# Altium schematic symbol library IC.SchLib: 555 symbols (part 6 of 15)
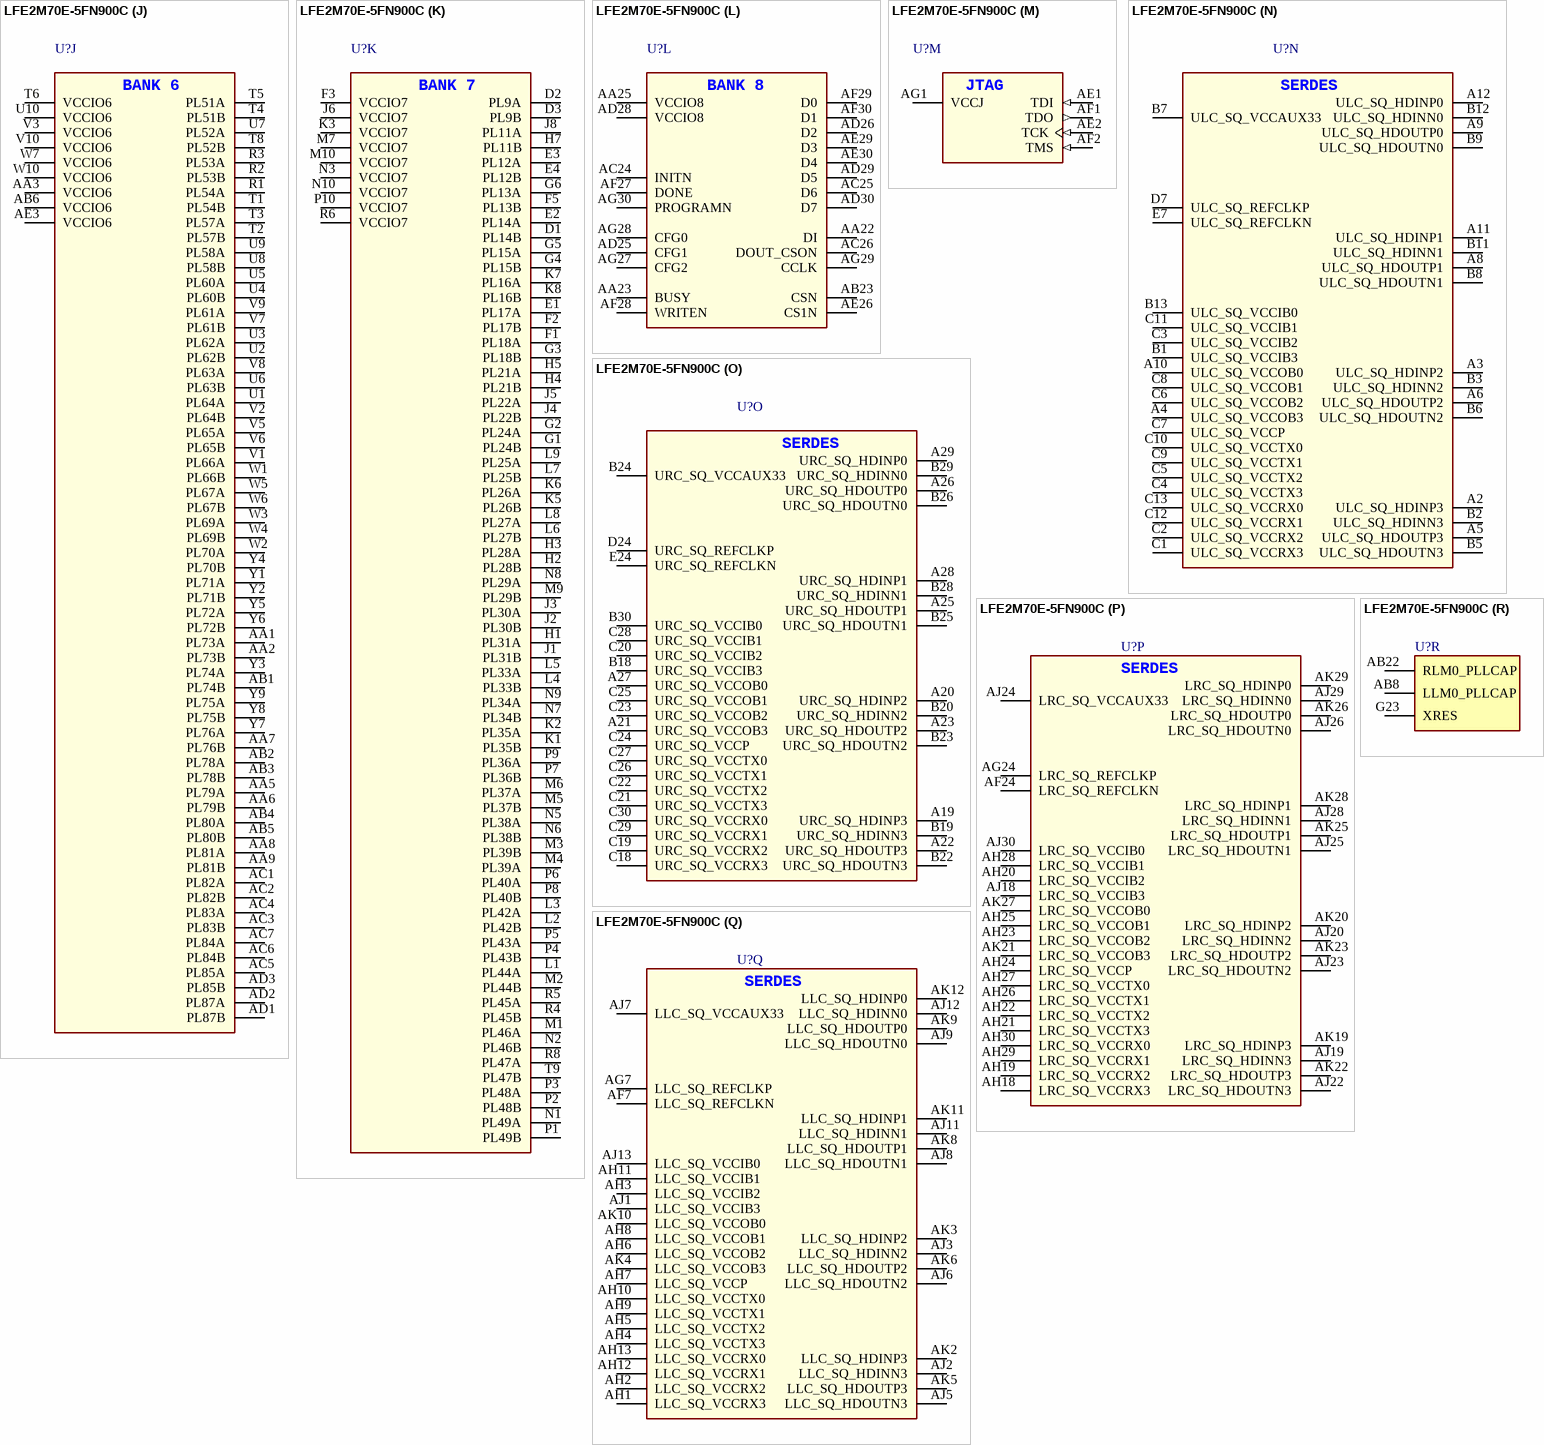
[diagram p75: symbol LFE2M70E-5FN900C]

## LFE2M70E-5FN900C
designator U?, comment LFE2M70-5FN900C  (value not drawn)
ECP2M 1.2V  FPGA, 416 I/Os, 95K LUTs, 900-Ball fpBGA, Speed Grade 5, Commercial Grade, Pb-Free; Manufacturer: Lattice; Sort: 510; Tech: SMDR; Manufacturer No: LFE2M70-5FN900C; Package: FPBGA900; Price: 0
footprint FPBGA900 (BGA, 900-Leads, Body 31,0x31,0mm,  Pitch 1,00mm)
part A pins: AA10 VCCAUX (power), AA11 VCCAUX (power), AA20 VCCAUX (power), AA21 VCCAUX (power), K10 VCCAUX (power), K11 VCCAUX (power), K20 VCCAUX (power), K21 VCCAUX (power), L10 VCCAUX (power), L11 VCCAUX (power), L12 VCC (power), L13 VCC (power), L18 VCC (power), L19 VCC (power), L20 VCCAUX (power), L21 VCCAUX (power), M11 VCC (power), M12 VCC (power), M13 VCC (power), M14 VCC (power), M15 VCC (power), M16 VCC (power), M17 VCC (power), M18 VCC (power), M19 VCC (power), M20 VCC (power), N11 VCC (power), N12 VCC (power), N13 VCCPLL (power), N18 VCCPLL (power), N19 VCC (power), N20 VCC (power), P12 VCC (power), P19 VCC (power), R12 VCC (power), R19 VCC (power), T12 VCC (power), T19 VCC (power), U12 VCC (power), U19 VCC (power), V11 VCC (power), V12 VCC (power), V13 VCCPLL (power), V18 VCCPLL (power), V19 VCC (power), V20 VCC (power), W11 VCC (power), W12 VCC (power), W13 VCC (power), W14 VCC (power), W15 VCC (power), W16 VCC (power), W17 VCC (power), W18 VCC (power), W19 VCC (power), W20 VCC (power), Y10 VCCAUX (power), Y11 VCCAUX (power), Y12 VCC (power), Y13 VCC (power), Y18 VCC (power), Y19 VCC (power), Y20 VCCAUX (power), Y21 VCCAUX (power)
part B pins: A1 GND (power), A7 GND (power), A13 GND (power), A18 GND (power), A24 GND (power), A30 GND (power), AA4 GND (power), AA14 GND (power), AA15 GND (power), AA16 GND (power), AA17 GND (power), AA24 GND (power), AA27 GND (power), AB7 GND (power), AB24 GND (power), AD12 GND (power), AD19 GND (power), AD27 GND (power), AE4 GND (power), AE9 GND (power), AE22 GND (power), AE27 GND (power), AF6 GND (power), AF14 GND (power), AF17 GND (power), AF25 GND (power), AJ4 GND (power), AJ10 GND (power), AJ21 GND (power), AJ27 GND (power), AK1 GND (power), AK7 GND (power), AK13 GND (power), AK18 GND (power), AK24 GND (power), AK30 GND (power), B4 GND (power), B10 GND (power), B21 GND (power), B27 GND (power), D6 GND (power), D25 GND (power), E14 GND (power), E17 GND (power), F4 GND (power), F9 GND (power), F22 GND (power), F27 GND (power), G12 GND (power), G19 GND (power), J7 GND (power), J24 GND (power), K4 GND (power), K14 GND (power), K15 GND (power), K16 GND (power), K17 GND (power), K27 GND (power), L14 GND (power), L15 GND (power), L16 GND (power), L17 GND (power), M8 GND (power), M23 GND (power), N4 GND (power), N14 GND (power), N15 GND (power), N16 GND (power), N17 GND (power), N27 GND (power), P11 GND (power), P13 GND (power), P14 GND (power), P15 GND (power), P16 GND (power), P17 GND (power), P18 GND (power), P20 GND (power), R7 GND (power), R10 GND (power), R11 GND (power), R13 GND (power), R14 GND (power), R15 GND (power), R16 GND (power), R17 GND (power), R18 GND (power), R20 GND (power), R21 GND (power), R24 GND (power), T7 GND (power), T10 GND (power), T11 GND (power), T13 GND (power), T14 GND (power), T15 GND (power), T16 GND (power), T17 GND (power), T18 GND (power), T20 GND (power), T21 GND (power), T24 GND (power), U11 GND (power), U13 GND (power), U14 GND (power), U15 GND (power), U16 GND (power), U17 GND (power), U18 GND (power), U20 GND (power), V4 GND (power), V14 GND (power), V15 GND (power), V16 GND (power), V17 GND (power), V27 GND (power), W8 GND (power), W23 GND (power), Y14 GND (power), Y15 GND (power), Y16 GND (power), Y17 GND (power)
part C pins: AA26 NC, AB9 NC, AB10 NC, AB11 NC, AB12 NC, AB13 NC, AB14 NC, AB15 NC, AB16 NC, AB17 NC, AB19 NC, AB20 NC, AB21 NC, AC8 NC, AC9 NC, AC10 NC, AC11 NC, AC21 NC, AC22 NC, AD4 NC, AD5 NC, AD6 NC, AD7 NC, AD8 NC, AD21 NC, AD22 NC, AE5 NC, AE6 NC, AE7 NC, AE23 NC, AF5 NC, AF20 NC, AF23 NC, AG23 NC, AG26 NC, D10 NC, E10 NC, E11 NC, F8 NC, F10 NC, F20 NC, F23 NC, G7 NC, G8 NC, G9 NC, G10 NC, G20 NC, G21 NC, H6 NC, H8 NC, H9 NC, H19 NC, H20 NC, H21 NC, H22 NC, J9 NC, J10 NC, J20 NC, J21 NC, K9 NC, R9 NC, U22 NC, W9 NC
part D pins: A14 PT51B, B14 PT51A, C14 PT54B, C15 PT55B, D4 PT47B, D5 PT47A, D8 PT43A, D9 PT39A, D11 PT30A, D12 PT37B, D13 PT50B, D14 VCCIO0 (power), D15 PT55A, E5 PT46B, E6 VCCIO0 (power), E8 PT39B, E9 VCCIO0 (power), E12 PT30B, E13 PT37A, E15 PT54A, F6 PT46A, F7 PT43B, F11 PT29A, F12 VCCIO0 (power), F13 PT50A, F14 PT52B, G11 PT41A, G13 PT49B, G14 PT53B, H10 PT31A, H11 PT29B, H12 PT40A, H13 PT40B, H14 PT52A, J11 PT49A, J12 PT31B, J13 PT41B, J14 PT53A, K12 VCCIO0 (power), K13 VCCIO0 (power)
part E pins: A15 PT57B, A16 PT63B, A17 PT73B, B15 PT57A, B16 PT63A, B17 PT73A, C16 PT59B, C17 PT74A, D16 PT59A, D17 VCCIO1 (power), D18 PT74B, D19 PT75B, D20 PT77B, D21 PT77A, D22 PT79B, D23 PT82B, D26 PT81B, E16 PT56A, E18 PT75A, E19 PT76A, E20 PT76B, E21 PT82A, E22 VCCIO1 (power), E23 PT80B, E25 VCCIO1 (power), E26 PT81A, F15 PT56B, F16 PT61A, F17 PT64A, F18 PT64B, F19 VCCIO1 (power), F21 PT79A, G15 PT60A, G16 PT62A, G17 PT62B, G18 PT78B, G22 PT80A, H15 PT58A, H16 PT61B, H17 PT65B, H18 PT78A, J15 PT58B, J16 PT60B, J17 PT65A, J18 PT66B, J19 PT66A, K18 VCCIO1 (power), K19 VCCIO1 (power)
part F pins: D27 PR12B, D28 PR14B, D29 PR25A, D30 PR25B, E27 PR12A, E28 PR14A, E29 PR30A, E30 PR30B, F24 PR9B, F25 PR9A, F26 PR11B, F28 VCCIO2 (power), F29 PR31A, F30 PR31B, G24 PR13B, G25 PR11A, G26 PR16A, G27 PR27A, G28 PR27B, G29 PR34A, G30 PR38A, H23 PR15B, H24 PR15A, H25 PR13A, H26 PR17A, H27 PR16B, H28 PR28B, H29 PR34B, H30 PR38B, J22 PR20B, J23 PR20A, J25 VCCIO2 (power), J26 PR17B, J27 PR22B, J28 PR28A, J29 PR43A, J30 PR43B, K22 PR21A, K23 PR21B, K24 PR24B, K25 PR24A, K26 PR22A, K28 VCCIO2 (power), K29 PR45A, K30 PR45B, L22 PR33B, L23 PR26A, L24 PR26B, L25 PR29B, L26 PR29A, L27 PR35A, L28 PR35B, L29 PR36A, L30 PR36B, M21 VCCIO2 (power), M22 PR33A, M24 VCCIO2 (power), M25 PR37B, M26 PR37A, M27 PR39B, M28 PR39A, M29 PR49A, M30 PR49B, N21 VCCIO2 (power), N22 PR44B, N23 PR42A, N24 PR42B, N25 PR40B, N26 PR40A, N28 VCCIO2 (power), P21 VCCIO2 (power), P22 PR44A, P23 PR48B, P24 PR48A, P25 PR46B, P26 PR46A, P27 PR47A, R25 VCCIO2 (power), R26 PR47B
part G pins: AA28 VCCIO3 (power), AA29 PR78B, AA30 PR83A, AB25 VCCIO3 (power), AB26 PR80B, AB27 PR80A, AB28 PR82A, AB29 PR82B, AB30 PR83B, AC27 PR85B, AC28 PR85A, AC29 PR84B, AC30 PR84A, AE28 VCCIO3 (power), N29 PR53A, N30 PR53B, P28 PR51A, P29 PR51B, P30 PR57B, R22 PR58A, R23 PR58B, R27 PR52B, R28 PR52A, R29 PR57A, R30 PR62A, T22 PR61A, T23 PR61B, T25 VCCIO3 (power), T26 PR56A, T27 PR56B, T28 PR60A, T29 PR60B, T30 PR62B, U21 VCCIO3 (power), U23 PR65B, U24 PR63A, U25 PR63B, U26 PR64A, U27 PR66A, U28 PR66B, U29 PR71B, U30 PR70A, V21 VCCIO3 (power), V22 PR75A, V23 PR65A, V24 PR67B, V25 PR67A, V26 PR64B, V28 VCCIO3 (power), V29 PR71A, V30 PR70B, W21 VCCIO3 (power), W22 PR75B, W24 VCCIO3 (power), W25 PR72B, W26 PR72A, W27 PR69B, W28 PR69A, W29 PR73A, W30 PR73B, Y22 PR81B, Y23 PR81A, Y24 PR79B, Y25 PR79A, Y26 PR74A, Y27 PR74B, Y28 PR78A, Y29 PR76A, Y30 PR76B
part H pins: AA18 VCCIO4 (power), AA19 VCCIO4 (power), AB18 PB79A, AC17 PB62B, AC18 PB75B, AC19 PB78A, AC20 PB79B, AC23 PB81A, AD16 PB60B, AD17 PB67A, AD18 PB75A, AD20 PB78B, AD23 PB81B, AD24 PB74A, AE17 PB62A, AE18 PB76A, AE19 VCCIO4 (power), AE20 PB80A, AE21 PB80B, AE24 PB74B, AE25 PB73B, AF18 PB60A, AF19 PB67B, AF21 PB66A, AF22 VCCIO4 (power), AF26 PB73A, AG16 PB61B, AG17 VCCIO4 (power), AG18 PB65A, AG19 PB76B, AG20 PB64A, AG21 PB64B, AG22 PB66B, AG25 VCCIO4 (power), AH16 PB63A, AH17 PB71A, AJ14 PB58A, AJ15 PB61A, AJ16 PB65B, AJ17 PB71B, AK14 PB58B, AK15 PB59A, AK16 PB59B, AK17 PB63B
part I pins: AA12 VCCIO5 (power), AA13 VCCIO5 (power), AC12 PB33B, AC13 PB35B, AC14 PB36B, AC15 PB42B, AC16 PB52A, AD9 PB31B, AD10 PB32B, AD11 PB39A, AD13 PB35A, AD14 PB40B, AD15 PB47A, AE8 PB30B, AE10 PB32A, AE11 PB31A, AE12 VCCIO5 (power), AE13 PB33A, AE14 PB36A, AE15 PB42A, AE16 PB52B, AF3 PB37A, AF4 PB37B, AF8 PB41B, AF9 VCCIO5 (power), AF10 PB30A, AF11 PB53B, AF12 PB40A, AF13 PB39B, AF15 PB47B, AF16 PB51A, AG2 PB34A, AG3 PB34B, AG4 PB38A, AG5 PB38B, AG6 VCCIO5 (power), AG8 PB41A, AG9 PB48B, AG10 PB48A, AG11 PB53A, AG12 PB49B, AG13 PB50B, AG14 VCCIO5 (power), AG15 PB50A, AH14 PB49A, AH15 PB51B
part J pins: AA1 PL73A, AA2 PL73B, AA3 VCCIO6 (power), AA5 PL79A, AA6 PL79B, AA7 PL76B, AA8 PL81A, AA9 PL81B, AB1 PL74B, AB2 PL78A, AB3 PL78B, AB4 PL80A, AB5 PL80B, AB6 VCCIO6 (power), AC1 PL82A, AC2 PL82B, AC3 PL83B, AC4 PL83A, AC5 PL85A, AC6 PL84B, AC7 PL84A, AD1 PL87B, AD2 PL87A, AD3 PL85B, AE3 VCCIO6 (power), R1 PL54A, R2 PL53B, R3 PL53A, T1 PL54B, T2 PL57B, T3 PL57A, T4 PL51B, T5 PL51A, T6 VCCIO6 (power), T8 PL52B, U1 PL64A, U2 PL62B, U3 PL62A, U4 PL60B, U5 PL60A, U6 PL63B, U7 PL52A, U8 PL58B, U9 PL58A, U10 VCCIO6 (power), V1 PL66A, V2 PL64B, V3 VCCIO6 (power), V5 PL65A, V6 PL65B, V7 PL61B, V8 PL63A, V9 PL61A, V10 VCCIO6 (power), W1 PL66B, W2 PL70A, W3 PL69A, W4 PL69B, W5 PL67A, W6 PL67B, W7 VCCIO6 (power), W10 VCCIO6 (power), Y1 PL71A, Y2 PL71B, Y3 PL74A, Y4 PL70B, Y5 PL72A, Y6 PL72B, Y7 PL76A, Y8 PL75B, Y9 PL75A
part K pins: D1 PL14B, D2 PL9A, D3 PL9B, E1 PL17A, E2 PL14A, E3 PL12A, E4 PL12B, F1 PL18A, F2 PL17B, F3 VCCIO7 (power), F5 PL13B, G1 PL24B, G2 PL24A, G3 PL18B, G4 PL15B, G5 PL15A, G6 PL13A, H1 PL31A, H2 PL28B, H3 PL28A, H4 PL21B, H5 PL21A, H7 PL11B, J1 PL31B, J2 PL30B, J3 PL30A, J4 PL22B, J5 PL22A, J6 VCCIO7 (power), J8 PL11A, K1 PL35B, K2 PL35A, K3 VCCIO7 (power), K5 PL26B, K6 PL26A, K7 PL16A, K8 PL16B, L1 PL44A, L2 PL42B, L3 PL42A, L4 PL33B, L5 PL33A, L6 PL27B, L7 PL25B, L8 PL27A, L9 PL25A, M1 PL46A, M2 PL44B, M3 PL39B, M4 PL39A, M5 PL37B, M6 PL37A, M7 VCCIO7 (power), M9 PL29B, M10 VCCIO7 (power), N1 PL49A, N2 PL46B, N3 VCCIO7 (power), N5 PL38A, N6 PL38B, N7 PL34B, N8 PL29A, N9 PL34A, N10 VCCIO7 (power), P1 PL49B, P2 PL48B, P3 PL48A, P4 PL43B, P5 PL43A, P6 PL40A, P7 PL36B, P8 PL40B, P9 PL36A, P10 VCCIO7 (power), R4 PL45B, R5 PL45A, R6 VCCIO7 (power), R8 PL47A, T9 PL47B
part L pins: AA22 DI, AA23 BUSY, AA25 VCCIO8 (power), AB23 CSN, AC24 INITN, AC25 D6, AC26 DOUT_CSON, AD25 CFG1, AD26 D2, AD28 VCCIO8 (power), AD29 D5, AD30 D7, AE26 CS1N, AE29 D3, AE30 D4, AF27 DONE, AF28 WRITEN, AF29 D0, AF30 D1, AG27 CFG2, AG28 CFG0, AG29 CCLK, AG30 PROGRAMN
part M pins: AE1 TDI (in), AE2 TCK (in), AF1 TDO (out), AF2 TMS (in), AG1 VCCJ (power)
part N pins: A2 ULC_SQ_HDINP3, A3 ULC_SQ_HDINP2, A4 ULC_SQ_VCCOB3, A5 ULC_SQ_HDOUTP3, A6 ULC_SQ_HDOUTP2, A8 ULC_SQ_HDOUTP1, A9 ULC_SQ_HDOUTP0, A10 ULC_SQ_VCCOB0, A11 ULC_SQ_HDINP1, A12 ULC_SQ_HDINP0, B1 ULC_SQ_VCCIB3, B2 ULC_SQ_HDINN3, B3 ULC_SQ_HDINN2, B5 ULC_SQ_HDOUTN3, B6 ULC_SQ_HDOUTN2, B7 ULC_SQ_VCCAUX33, B8 ULC_SQ_HDOUTN1, B9 ULC_SQ_HDOUTN0, B11 ULC_SQ_HDINN1, B12 ULC_SQ_HDINN0, B13 ULC_SQ_VCCIB0, C1 ULC_SQ_VCCRX3, C2 ULC_SQ_VCCRX2, C3 ULC_SQ_VCCIB2, C4 ULC_SQ_VCCTX3, C5 ULC_SQ_VCCTX2, C6 ULC_SQ_VCCOB2, C7 ULC_SQ_VCCP, C8 ULC_SQ_VCCOB1, C9 ULC_SQ_VCCTX1, C10 ULC_SQ_VCCTX0, C11 ULC_SQ_VCCIB1, C12 ULC_SQ_VCCRX1, C13 ULC_SQ_VCCRX0, D7 ULC_SQ_REFCLKP, E7 ULC_SQ_REFCLKN
part O pins: A19 URC_SQ_HDINP3, A20 URC_SQ_HDINP2, A21 URC_SQ_VCCOB3, A22 URC_SQ_HDOUTP3, A23 URC_SQ_HDOUTP2, A25 URC_SQ_HDOUTP1, A26 URC_SQ_HDOUTP0, A27 URC_SQ_VCCOB0, A28 URC_SQ_HDINP1, A29 URC_SQ_HDINP0, B18 URC_SQ_VCCIB3, B19 URC_SQ_HDINN3, B20 URC_SQ_HDINN2, B22 URC_SQ_HDOUTN3, B23 URC_SQ_HDOUTN2, B24 URC_SQ_VCCAUX33, B25 URC_SQ_HDOUTN1, B26 URC_SQ_HDOUTN0, B28 URC_SQ_HDINN1, B29 URC_SQ_HDINN0, B30 URC_SQ_VCCIB0, C18 URC_SQ_VCCRX3, C19 URC_SQ_VCCRX2, C20 URC_SQ_VCCIB2, C21 URC_SQ_VCCTX3, C22 URC_SQ_VCCTX2, C23 URC_SQ_VCCOB2, C24 URC_SQ_VCCP, C25 URC_SQ_VCCOB1, C26 URC_SQ_VCCTX1, C27 URC_SQ_VCCTX0, C28 URC_SQ_VCCIB1, C29 URC_SQ_VCCRX1, C30 URC_SQ_VCCRX0, D24 URC_SQ_REFCLKP, E24 URC_SQ_REFCLKN
part P pins: AF24 LRC_SQ_REFCLKN, AG24 LRC_SQ_REFCLKP, AH18 LRC_SQ_VCCRX3, AH19 LRC_SQ_VCCRX2, AH20 LRC_SQ_VCCIB2, AH21 LRC_SQ_VCCTX3, AH22 LRC_SQ_VCCTX2, AH23 LRC_SQ_VCCOB2, AH24 LRC_SQ_VCCP, AH25 LRC_SQ_VCCOB1, AH26 LRC_SQ_VCCTX1, AH27 LRC_SQ_VCCTX0, AH28 LRC_SQ_VCCIB1, AH29 LRC_SQ_VCCRX1, AH30 LRC_SQ_VCCRX0, AJ18 LRC_SQ_VCCIB3, AJ19 LRC_SQ_HDINN3, AJ20 LRC_SQ_HDINN2, AJ22 LRC_SQ_HDOUTN3, AJ23 LRC_SQ_HDOUTN2, AJ24 LRC_SQ_VCCAUX33, AJ25 LRC_SQ_HDOUTN1, AJ26 LRC_SQ_HDOUTN0, AJ28 LRC_SQ_HDINN1, AJ29 LRC_SQ_HDINN0, AJ30 LRC_SQ_VCCIB0, AK19 LRC_SQ_HDINP3, AK20 LRC_SQ_HDINP2, AK21 LRC_SQ_VCCOB3, AK22 LRC_SQ_HDOUTP3, AK23 LRC_SQ_HDOUTP2, AK25 LRC_SQ_HDOUTP1, AK26 LRC_SQ_HDOUTP0, AK27 LRC_SQ_VCCOB0, AK28 LRC_SQ_HDINP1, AK29 LRC_SQ_HDINP0
part Q pins: AF7 LLC_SQ_REFCLKN, AG7 LLC_SQ_REFCLKP, AH1 LLC_SQ_VCCRX3, AH2 LLC_SQ_VCCRX2, AH3 LLC_SQ_VCCIB2, AH4 LLC_SQ_VCCTX3, AH5 LLC_SQ_VCCTX2, AH6 LLC_SQ_VCCOB2, AH7 LLC_SQ_VCCP, AH8 LLC_SQ_VCCOB1, AH9 LLC_SQ_VCCTX1, AH10 LLC_SQ_VCCTX0, AH11 LLC_SQ_VCCIB1, AH12 LLC_SQ_VCCRX1, AH13 LLC_SQ_VCCRX0, AJ1 LLC_SQ_VCCIB3, AJ2 LLC_SQ_HDINN3, AJ3 LLC_SQ_HDINN2, AJ5 LLC_SQ_HDOUTN3, AJ6 LLC_SQ_HDOUTN2, AJ7 LLC_SQ_VCCAUX33, AJ8 LLC_SQ_HDOUTN1, AJ9 LLC_SQ_HDOUTN0, AJ11 LLC_SQ_HDINN1, AJ12 LLC_SQ_HDINN0, AJ13 LLC_SQ_VCCIB0, AK2 LLC_SQ_HDINP3, AK3 LLC_SQ_HDINP2, AK4 LLC_SQ_VCCOB3, AK5 LLC_SQ_HDOUTP3, AK6 LLC_SQ_HDOUTP2, AK8 LLC_SQ_HDOUTP1, AK9 LLC_SQ_HDOUTP0, AK10 LLC_SQ_VCCOB0, AK11 LLC_SQ_HDINP1, AK12 LLC_SQ_HDINP0
part R pins: AB8 LLM0_PLLCAP, AB22 RLM0_PLLCAP, G23 XRES
part A text: SUPPLIES
part B text: SUPPLIES
part D text: BANK 0
part E text: BANK 1
part F text: BANK 2
part G text: BANK 3
part H text: BANK 4
part I text: BANK 5
part J text: BANK 6
part K text: BANK 7
part L text: BANK 8
part M text: JTAG
part N text: SERDES
part O text: SERDES
part P text: SERDES
part Q text: SERDES

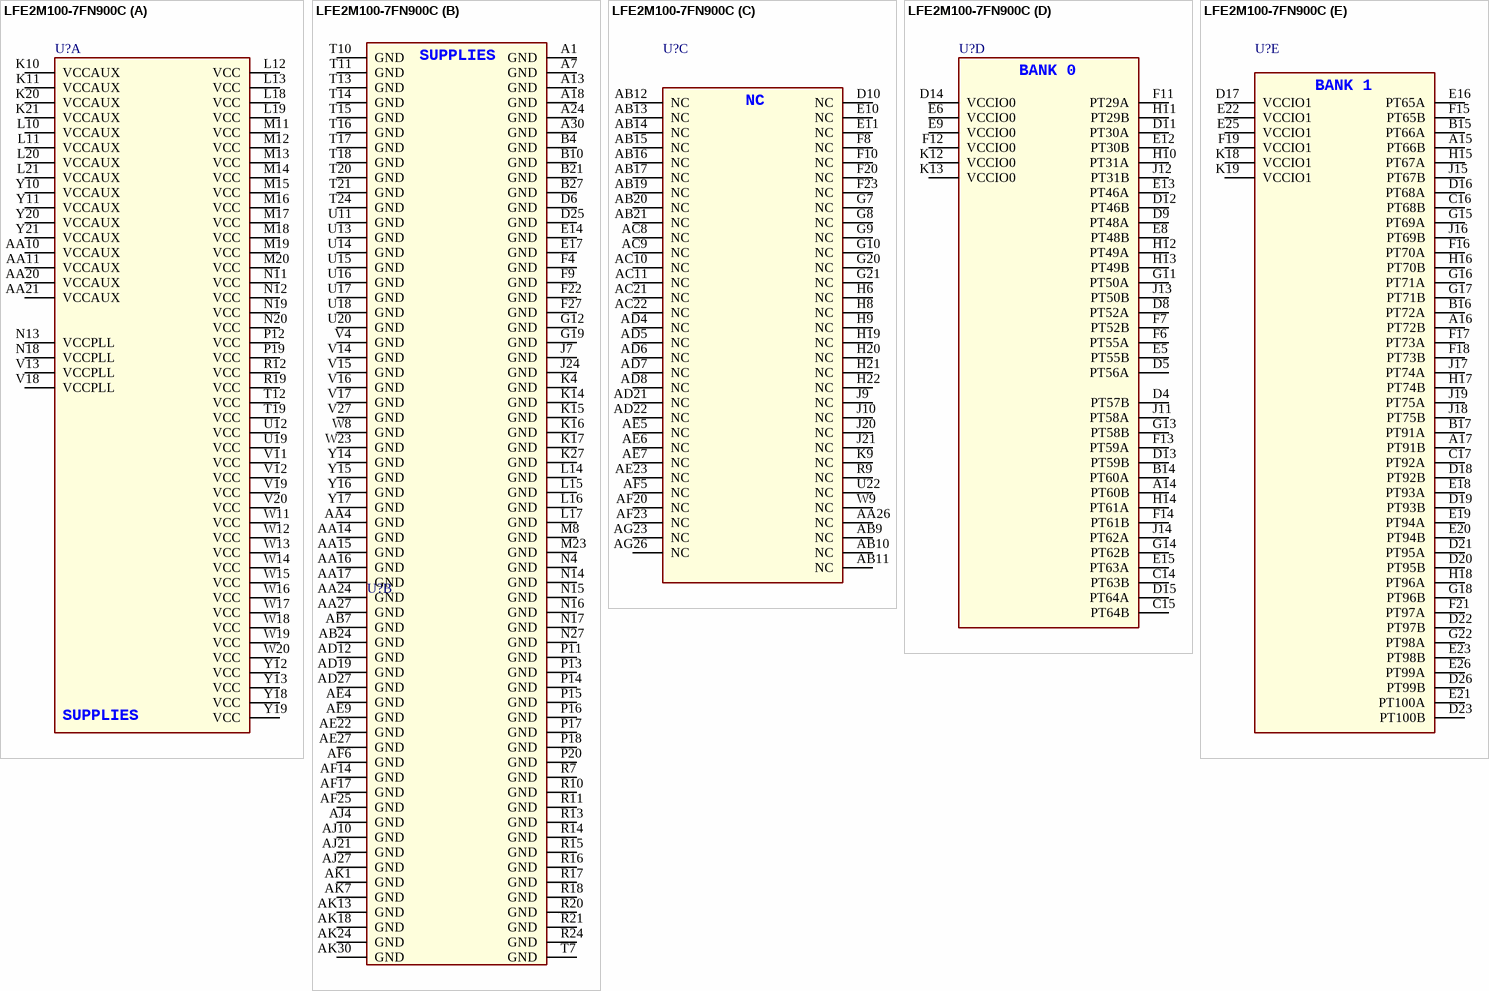
[diagram p20: symbol LFE2M100-7FN900C]

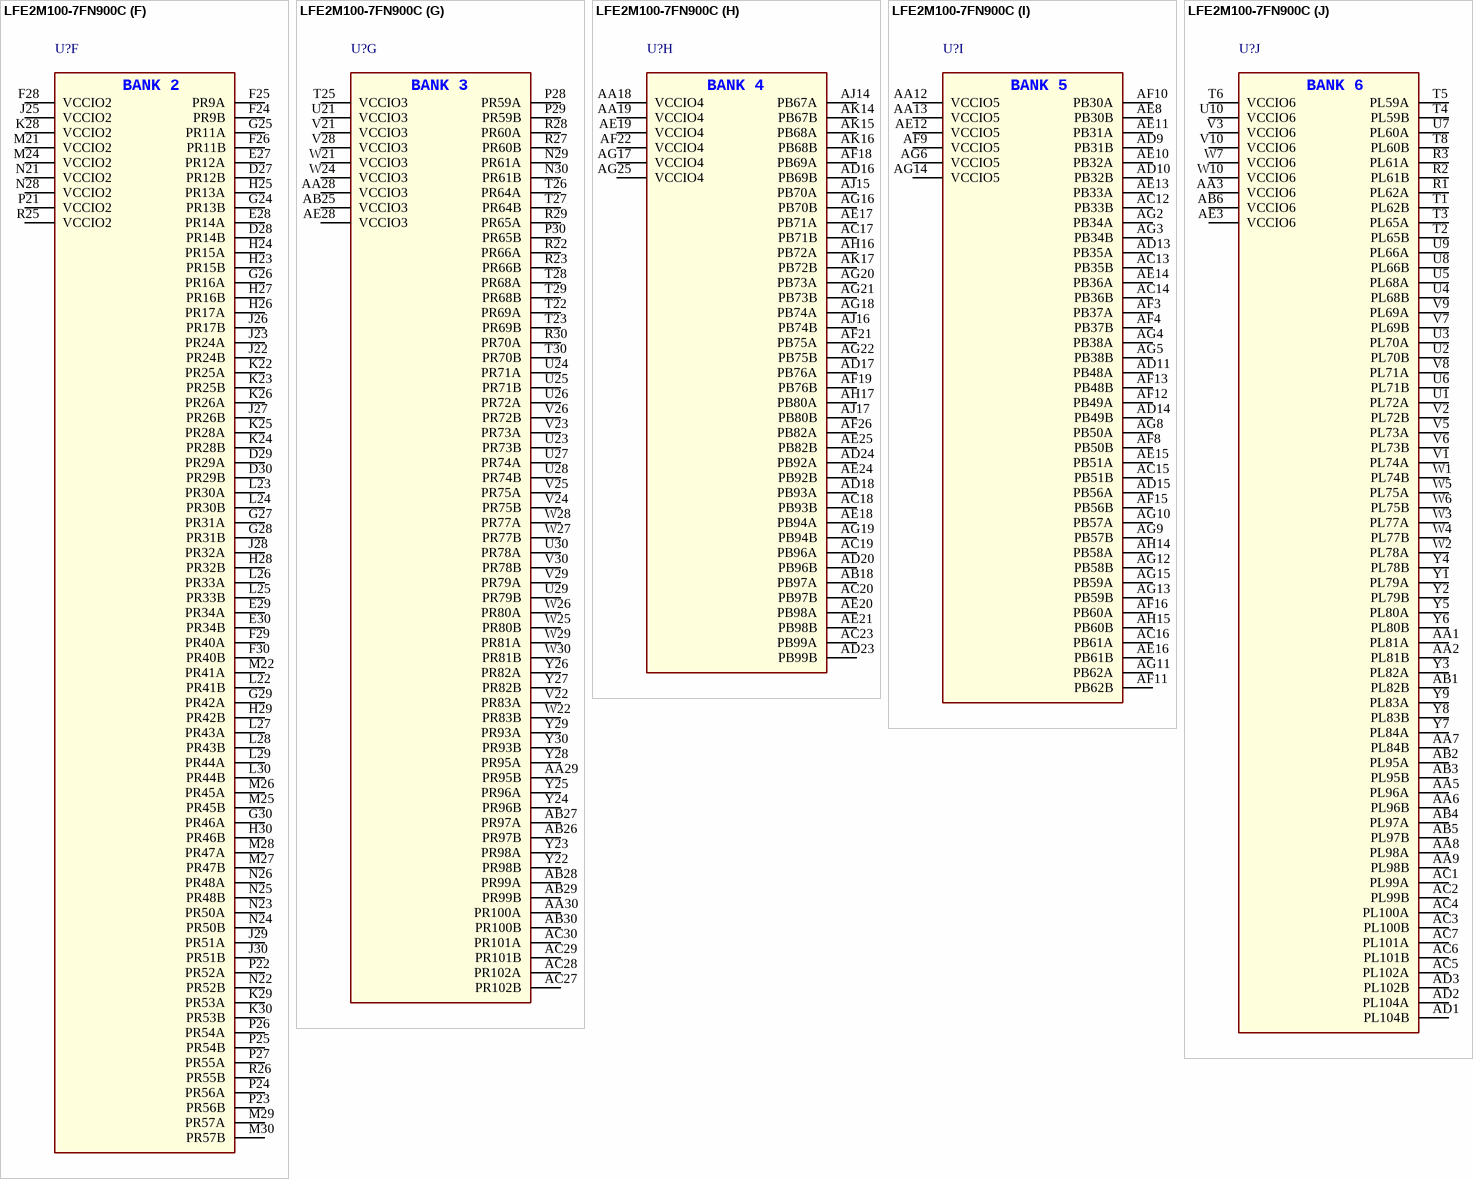
[diagram p21: symbol LFE2M100-7FN900C]

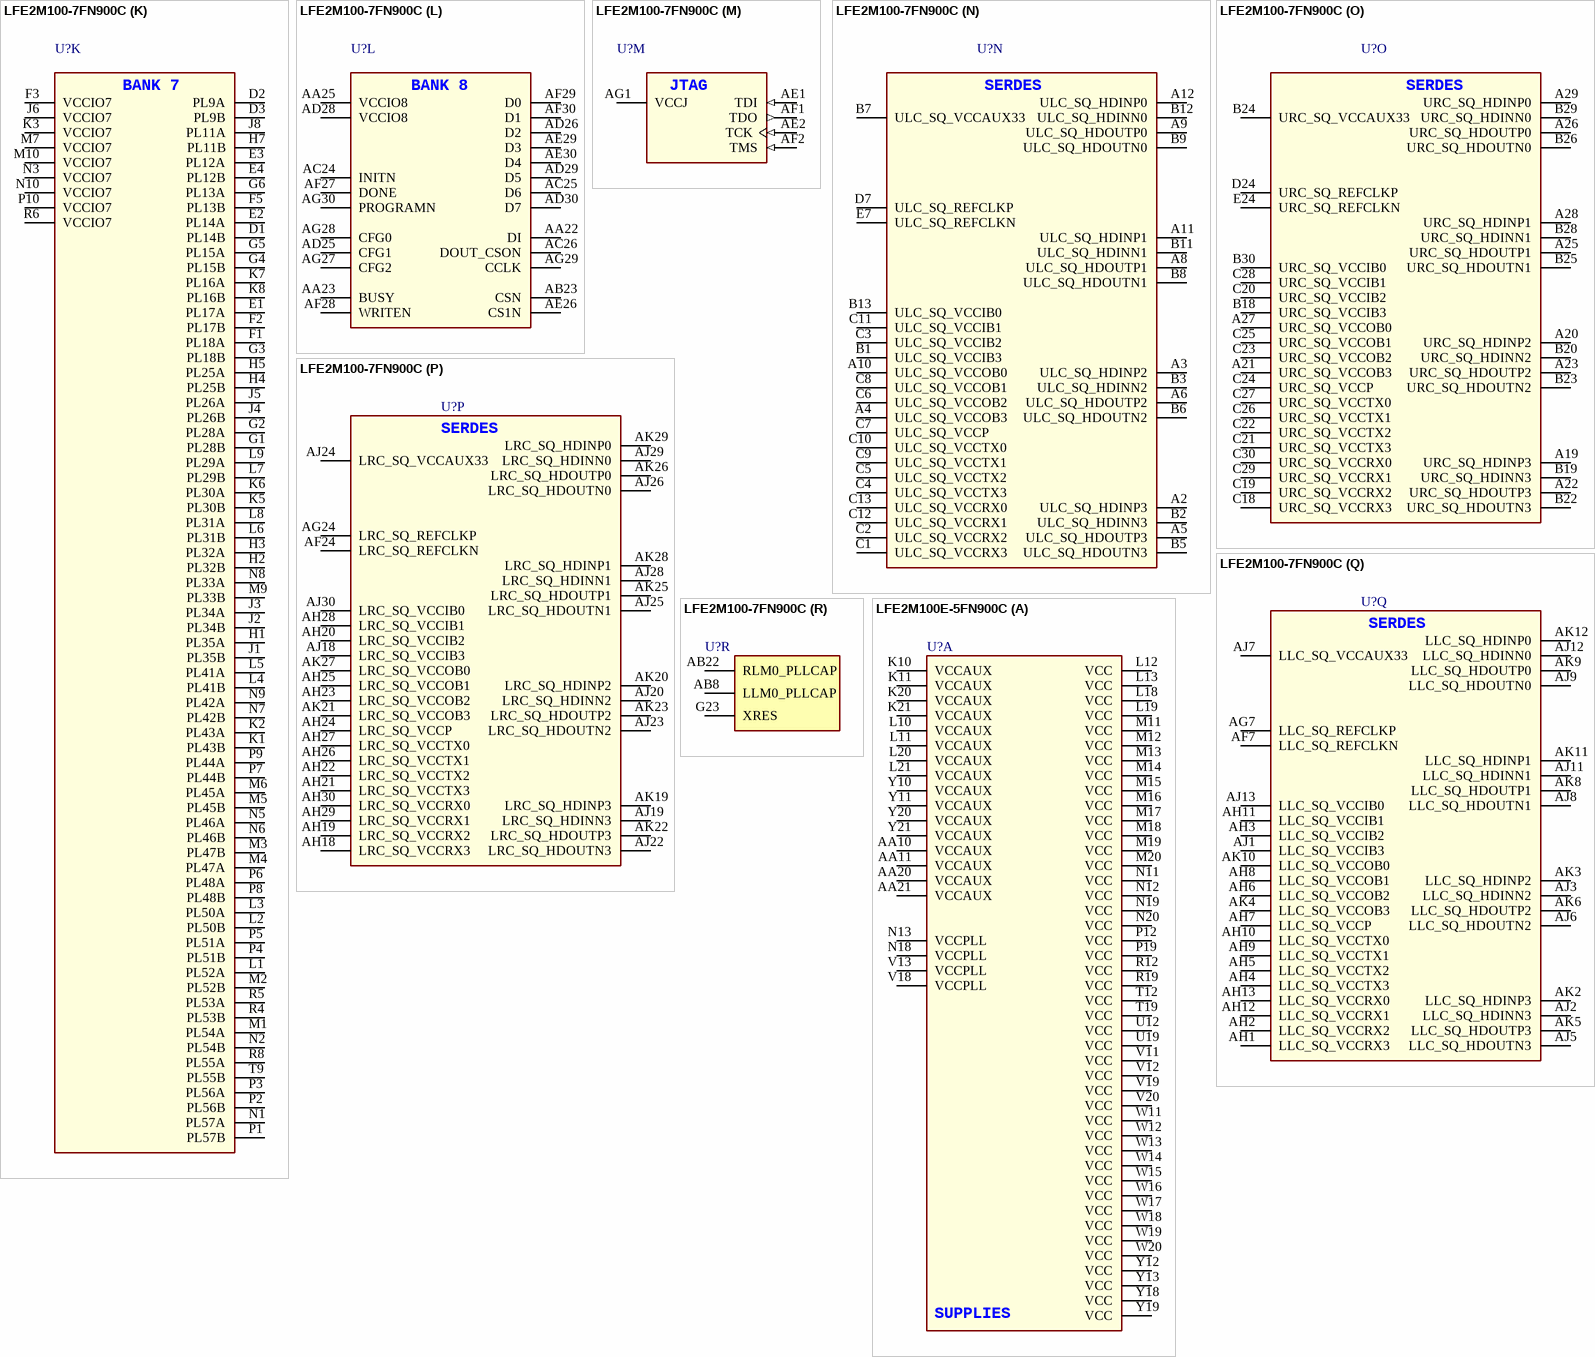
[diagram p22: symbols LFE2M100-7FN900C to LFE2M100E-5FN900C]

## LFE2M100-7FN900C
designator U?  (value not drawn)
ECP2M 1.2V  FPGA, 416 I/Os, 95K LUTs, 900-Ball fpBGA, Speed Grade 5, Commercial Grade, Pb-Free; Manufacturer: Lattice; Sort: 510; Tech: SMDR; Manufacturer No: LFE2M100-7FN900C; Package: FPBGA900; Price: 0
footprint FPBGA900 (BGA, 900-Leads, Body 31,0x31,0mm,  Pitch 1,00mm)
part A pins: AA10 VCCAUX (power), AA11 VCCAUX (power), AA20 VCCAUX (power), AA21 VCCAUX (power), K10 VCCAUX (power), K11 VCCAUX (power), K20 VCCAUX (power), K21 VCCAUX (power), L10 VCCAUX (power), L11 VCCAUX (power), L12 VCC (power), L13 VCC (power), L18 VCC (power), L19 VCC (power), L20 VCCAUX (power), L21 VCCAUX (power), M11 VCC (power), M12 VCC (power), M13 VCC (power), M14 VCC (power), M15 VCC (power), M16 VCC (power), M17 VCC (power), M18 VCC (power), M19 VCC (power), M20 VCC (power), N11 VCC (power), N12 VCC (power), N13 VCCPLL (power), N18 VCCPLL (power), N19 VCC (power), N20 VCC (power), P12 VCC (power), P19 VCC (power), R12 VCC (power), R19 VCC (power), T12 VCC (power), T19 VCC (power), U12 VCC (power), U19 VCC (power), V11 VCC (power), V12 VCC (power), V13 VCCPLL (power), V18 VCCPLL (power), V19 VCC (power), V20 VCC (power), W11 VCC (power), W12 VCC (power), W13 VCC (power), W14 VCC (power), W15 VCC (power), W16 VCC (power), W17 VCC (power), W18 VCC (power), W19 VCC (power), W20 VCC (power), Y10 VCCAUX (power), Y11 VCCAUX (power), Y12 VCC (power), Y13 VCC (power), Y18 VCC (power), Y19 VCC (power), Y20 VCCAUX (power), Y21 VCCAUX (power)
part B pins: A1 GND (power), A7 GND (power), A13 GND (power), A18 GND (power), A24 GND (power), A30 GND (power), AA4 GND (power), AA14 GND (power), AA15 GND (power), AA16 GND (power), AA17 GND (power), AA24 GND (power), AA27 GND (power), AB7 GND (power), AB24 GND (power), AD12 GND (power), AD19 GND (power), AD27 GND (power), AE4 GND (power), AE9 GND (power), AE22 GND (power), AE27 GND (power), AF6 GND (power), AF14 GND (power), AF17 GND (power), AF25 GND (power), AJ4 GND (power), AJ10 GND (power), AJ21 GND (power), AJ27 GND (power), AK1 GND (power), AK7 GND (power), AK13 GND (power), AK18 GND (power), AK24 GND (power), AK30 GND (power), B4 GND (power), B10 GND (power), B21 GND (power), B27 GND (power), D6 GND (power), D25 GND (power), E14 GND (power), E17 GND (power), F4 GND (power), F9 GND (power), F22 GND (power), F27 GND (power), G12 GND (power), G19 GND (power), J7 GND (power), J24 GND (power), K4 GND (power), K14 GND (power), K15 GND (power), K16 GND (power), K17 GND (power), K27 GND (power), L14 GND (power), L15 GND (power), L16 GND (power), L17 GND (power), M8 GND (power), M23 GND (power), N4 GND (power), N14 GND (power), N15 GND (power), N16 GND (power), N17 GND (power), N27 GND (power), P11 GND (power), P13 GND (power), P14 GND (power), P15 GND (power), P16 GND (power), P17 GND (power), P18 GND (power), P20 GND (power), R7 GND (power), R10 GND (power), R11 GND (power), R13 GND (power), R14 GND (power), R15 GND (power), R16 GND (power), R17 GND (power), R18 GND (power), R20 GND (power), R21 GND (power), R24 GND (power), T7 GND (power), T10 GND (power), T11 GND (power), T13 GND (power), T14 GND (power), T15 GND (power), T16 GND (power), T17 GND (power), T18 GND (power), T20 GND (power), T21 GND (power), T24 GND (power), U11 GND (power), U13 GND (power), U14 GND (power), U15 GND (power), U16 GND (power), U17 GND (power), U18 GND (power), U20 GND (power), V4 GND (power), V14 GND (power), V15 GND (power), V16 GND (power), V17 GND (power), V27 GND (power), W8 GND (power), W23 GND (power), Y14 GND (power), Y15 GND (power), Y16 GND (power), Y17 GND (power)
part C pins: AA26 NC, AB9 NC, AB10 NC, AB11 NC, AB12 NC, AB13 NC, AB14 NC, AB15 NC, AB16 NC, AB17 NC, AB19 NC, AB20 NC, AB21 NC, AC8 NC, AC9 NC, AC10 NC, AC11 NC, AC21 NC, AC22 NC, AD4 NC, AD5 NC, AD6 NC, AD7 NC, AD8 NC, AD21 NC, AD22 NC, AE5 NC, AE6 NC, AE7 NC, AE23 NC, AF5 NC, AF20 NC, AF23 NC, AG23 NC, AG26 NC, D10 NC, E10 NC, E11 NC, F8 NC, F10 NC, F20 NC, F23 NC, G7 NC, G8 NC, G9 NC, G10 NC, G20 NC, G21 NC, H6 NC, H8 NC, H9 NC, H19 NC, H20 NC, H21 NC, H22 NC, J9 NC, J10 NC, J20 NC, J21 NC, K9 NC, R9 NC, U22 NC, W9 NC
part D pins: A14 PT60B, B14 PT60A, C14 PT63B, C15 PT64B, D4 PT57B, D5 PT56A, D8 PT52A, D9 PT48A, D11 PT30A, D12 PT46B, D13 PT59B, D14 VCCIO0 (power), D15 PT64A, E5 PT55B, E6 VCCIO0 (power), E8 PT48B, E9 VCCIO0 (power), E12 PT30B, E13 PT46A, E15 PT63A, F6 PT55A, F7 PT52B, F11 PT29A, F12 VCCIO0 (power), F13 PT59A, F14 PT61B, G11 PT50A, G13 PT58B, G14 PT62B, H10 PT31A, H11 PT29B, H12 PT49A, H13 PT49B, H14 PT61A, J11 PT58A, J12 PT31B, J13 PT50B, J14 PT62A, K12 VCCIO0 (power), K13 VCCIO0 (power)
part E pins: A15 PT66B, A16 PT72B, A17 PT91B, B15 PT66A, B16 PT72A, B17 PT91A, C16 PT68B, C17 PT92A, D16 PT68A, D17 VCCIO1 (power), D18 PT92B, D19 PT93B, D20 PT95B, D21 PT95A, D22 PT97B, D23 PT100B, D26 PT99B, E16 PT65A, E18 PT93A, E19 PT94A, E20 PT94B, E21 PT100A, E22 VCCIO1 (power), E23 PT98B, E25 VCCIO1 (power), E26 PT99A, F15 PT65B, F16 PT70A, F17 PT73A, F18 PT73B, F19 VCCIO1 (power), F21 PT97A, G15 PT69A, G16 PT71A, G17 PT71B, G18 PT96B, G22 PT98A, H15 PT67A, H16 PT70B, H17 PT74B, H18 PT96A, J15 PT67B, J16 PT69B, J17 PT74A, J18 PT75B, J19 PT75A, K18 VCCIO1 (power), K19 VCCIO1 (power)
part F pins: D27 PR12B, D28 PR14B, D29 PR29A, D30 PR29B, E27 PR12A, E28 PR14A, E29 PR34A, E30 PR34B, F24 PR9B, F25 PR9A, F26 PR11B, F28 VCCIO2 (power), F29 PR40A, F30 PR40B, G24 PR13B, G25 PR11A, G26 PR16A, G27 PR31A, G28 PR31B, G29 PR42A, G30 PR46A, H23 PR15B, H24 PR15A, H25 PR13A, H26 PR17A, H27 PR16B, H28 PR32B, H29 PR42B, H30 PR46B, J22 PR24B, J23 PR24A, J25 VCCIO2 (power), J26 PR17B, J27 PR26B, J28 PR32A, J29 PR51A, J30 PR51B, K22 PR25A, K23 PR25B, K24 PR28B, K25 PR28A, K26 PR26A, K28 VCCIO2 (power), K29 PR53A, K30 PR53B, L22 PR41B, L23 PR30A, L24 PR30B, L25 PR33B, L26 PR33A, L27 PR43A, L28 PR43B, L29 PR44A, L30 PR44B, M21 VCCIO2 (power), M22 PR41A, M24 VCCIO2 (power), M25 PR45B, M26 PR45A, M27 PR47B, M28 PR47A, M29 PR57A, M30 PR57B, N21 VCCIO2 (power), N22 PR52B, N23 PR50A, N24 PR50B, N25 PR48B, N26 PR48A, N28 VCCIO2 (power), P21 VCCIO2 (power), P22 PR52A, P23 PR56B, P24 PR56A, P25 PR54B, P26 PR54A, P27 PR55A, R25 VCCIO2 (power), R26 PR55B
part G pins: AA28 VCCIO3 (power), AA29 PR95B, AA30 PR100A, AB25 VCCIO3 (power), AB26 PR97B, AB27 PR97A, AB28 PR99A, AB29 PR99B, AB30 PR100B, AC27 PR102B, AC28 PR102A, AC29 PR101B, AC30 PR101A, AE28 VCCIO3 (power), N29 PR61A, N30 PR61B, P28 PR59A, P29 PR59B, P30 PR65B, R22 PR66A, R23 PR66B, R27 PR60B, R28 PR60A, R29 PR65A, R30 PR70A, T22 PR69A, T23 PR69B, T25 VCCIO3 (power), T26 PR64A, T27 PR64B, T28 PR68A, T29 PR68B, T30 PR70B, U21 VCCIO3 (power), U23 PR73B, U24 PR71A, U25 PR71B, U26 PR72A, U27 PR74A, U28 PR74B, U29 PR79B, U30 PR78A, V21 VCCIO3 (power), V22 PR83A, V23 PR73A, V24 PR75B, V25 PR75A, V26 PR72B, V28 VCCIO3 (power), V29 PR79A, V30 PR78B, W21 VCCIO3 (power), W22 PR83B, W24 VCCIO3 (power), W25 PR80B, W26 PR80A, W27 PR77B, W28 PR77A, W29 PR81A, W30 PR81B, Y22 PR98B, Y23 PR98A, Y24 PR96B, Y25 PR96A, Y26 PR82A, Y27 PR82B, Y28 PR95A, Y29 PR93A, Y30 PR93B
part H pins: AA18 VCCIO4 (power), AA19 VCCIO4 (power), AB18 PB97A, AC17 PB71B, AC18 PB93B, AC19 PB96A, AC20 PB97B, AC23 PB99A, AD16 PB69B, AD17 PB76A, AD18 PB93A, AD20 PB96B, AD23 PB99B, AD24 PB92A, AE17 PB71A, AE18 PB94A, AE19 VCCIO4 (power), AE20 PB98A, AE21 PB98B, AE24 PB92B, AE25 PB82B, AF18 PB69A, AF19 PB76B, AF21 PB75A, AF22 VCCIO4 (power), AF26 PB82A, AG16 PB70B, AG17 VCCIO4 (power), AG18 PB74A, AG19 PB94B, AG20 PB73A, AG21 PB73B, AG22 PB75B, AG25 VCCIO4 (power), AH16 PB72A, AH17 PB80A, AJ14 PB67A, AJ15 PB70A, AJ16 PB74B, AJ17 PB80B, AK14 PB67B, AK15 PB68A, AK16 PB68B, AK17 PB72B
part I pins: AA12 VCCIO5 (power), AA13 VCCIO5 (power), AC12 PB33B, AC13 PB35B, AC14 PB36B, AC15 PB51B, AC16 PB61A, AD9 PB31B, AD10 PB32B, AD11 PB48A, AD13 PB35A, AD14 PB49B, AD15 PB56A, AE8 PB30B, AE10 PB32A, AE11 PB31A, AE12 VCCIO5 (power), AE13 PB33A, AE14 PB36A, AE15 PB51A, AE16 PB61B, AF3 PB37A, AF4 PB37B, AF8 PB50B, AF9 VCCIO5 (power), AF10 PB30A, AF11 PB62B, AF12 PB49A, AF13 PB48B, AF15 PB56B, AF16 PB60A, AG2 PB34A, AG3 PB34B, AG4 PB38A, AG5 PB38B, AG6 VCCIO5 (power), AG8 PB50A, AG9 PB57B, AG10 PB57A, AG11 PB62A, AG12 PB58B, AG13 PB59B, AG14 VCCIO5 (power), AG15 PB59A, AH14 PB58A, AH15 PB60B
part J pins: AA1 PL81A, AA2 PL81B, AA3 VCCIO6 (power), AA5 PL96A, AA6 PL96B, AA7 PL84B, AA8 PL98A, AA9 PL98B, AB1 PL82B, AB2 PL95A, AB3 PL95B, AB4 PL97A, AB5 PL97B, AB6 VCCIO6 (power), AC1 PL99A, AC2 PL99B, AC3 PL100B, AC4 PL100A, AC5 PL102A, AC6 PL101B, AC7 PL101A, AD1 PL104B, AD2 PL104A, AD3 PL102B, AE3 VCCIO6 (power), R1 PL62A, R2 PL61B, R3 PL61A, T1 PL62B, T2 PL65B, T3 PL65A, T4 PL59B, T5 PL59A, T6 VCCIO6 (power), T8 PL60B, U1 PL72A, U2 PL70B, U3 PL70A, U4 PL68B, U5 PL68A, U6 PL71B, U7 PL60A, U8 PL66B, U9 PL66A, U10 VCCIO6 (power), V1 PL74A, V2 PL72B, V3 VCCIO6 (power), V5 PL73A, V6 PL73B, V7 PL69B, V8 PL71A, V9 PL69A, V10 VCCIO6 (power), W1 PL74B, W2 PL78A, W3 PL77A, W4 PL77B, W5 PL75A, W6 PL75B, W7 VCCIO6 (power), W10 VCCIO6 (power), Y1 PL79A, Y2 PL79B, Y3 PL82A, Y4 PL78B, Y5 PL80A, Y6 PL80B, Y7 PL84A, Y8 PL83B, Y9 PL83A
part K pins: D1 PL14B, D2 PL9A, D3 PL9B, E1 PL17A, E2 PL14A, E3 PL12A, E4 PL12B, F1 PL18A, F2 PL17B, F3 VCCIO7 (power), F5 PL13B, G1 PL28B, G2 PL28A, G3 PL18B, G4 PL15B, G5 PL15A, G6 PL13A, H1 PL35A, H2 PL32B, H3 PL32A, H4 PL25B, H5 PL25A, H7 PL11B, J1 PL35B, J2 PL34B, J3 PL34A, J4 PL26B, J5 PL26A, J6 VCCIO7 (power), J8 PL11A, K1 PL43B, K2 PL43A, K3 VCCIO7 (power), K5 PL30B, K6 PL30A, K7 PL16A, K8 PL16B, L1 PL52A, L2 PL50B, L3 PL50A, L4 PL41B, L5 PL41A, L6 PL31B, L7 PL29B, L8 PL31A, L9 PL29A, M1 PL54A, M2 PL52B, M3 PL47B, M4 PL47A, M5 PL45B, M6 PL45A, M7 VCCIO7 (power), M9 PL33B, M10 VCCIO7 (power), N1 PL57A, N2 PL54B, N3 VCCIO7 (power), N5 PL46A, N6 PL46B, N7 PL42B, N8 PL33A, N9 PL42A, N10 VCCIO7 (power), P1 PL57B, P2 PL56B, P3 PL56A, P4 PL51B, P5 PL51A, P6 PL48A, P7 PL44B, P8 PL48B, P9 PL44A, P10 VCCIO7 (power), R4 PL53B, R5 PL53A, R6 VCCIO7 (power), R8 PL55A, T9 PL55B
part L pins: AA22 DI, AA23 BUSY, AA25 VCCIO8 (power), AB23 CSN, AC24 INITN, AC25 D6, AC26 DOUT_CSON, AD25 CFG1, AD26 D2, AD28 VCCIO8 (power), AD29 D5, AD30 D7, AE26 CS1N, AE29 D3, AE30 D4, AF27 DONE, AF28 WRITEN, AF29 D0, AF30 D1, AG27 CFG2, AG28 CFG0, AG29 CCLK, AG30 PROGRAMN
part M pins: AE1 TDI (in), AE2 TCK (in), AF1 TDO (out), AF2 TMS (in), AG1 VCCJ (power)
part N pins: A2 ULC_SQ_HDINP3, A3 ULC_SQ_HDINP2, A4 ULC_SQ_VCCOB3, A5 ULC_SQ_HDOUTP3, A6 ULC_SQ_HDOUTP2, A8 ULC_SQ_HDOUTP1, A9 ULC_SQ_HDOUTP0, A10 ULC_SQ_VCCOB0, A11 ULC_SQ_HDINP1, A12 ULC_SQ_HDINP0, B1 ULC_SQ_VCCIB3, B2 ULC_SQ_HDINN3, B3 ULC_SQ_HDINN2, B5 ULC_SQ_HDOUTN3, B6 ULC_SQ_HDOUTN2, B7 ULC_SQ_VCCAUX33, B8 ULC_SQ_HDOUTN1, B9 ULC_SQ_HDOUTN0, B11 ULC_SQ_HDINN1, B12 ULC_SQ_HDINN0, B13 ULC_SQ_VCCIB0, C1 ULC_SQ_VCCRX3, C2 ULC_SQ_VCCRX2, C3 ULC_SQ_VCCIB2, C4 ULC_SQ_VCCTX3, C5 ULC_SQ_VCCTX2, C6 ULC_SQ_VCCOB2, C7 ULC_SQ_VCCP, C8 ULC_SQ_VCCOB1, C9 ULC_SQ_VCCTX1, C10 ULC_SQ_VCCTX0, C11 ULC_SQ_VCCIB1, C12 ULC_SQ_VCCRX1, C13 ULC_SQ_VCCRX0, D7 ULC_SQ_REFCLKP, E7 ULC_SQ_REFCLKN
part O pins: A19 URC_SQ_HDINP3, A20 URC_SQ_HDINP2, A21 URC_SQ_VCCOB3, A22 URC_SQ_HDOUTP3, A23 URC_SQ_HDOUTP2, A25 URC_SQ_HDOUTP1, A26 URC_SQ_HDOUTP0, A27 URC_SQ_VCCOB0, A28 URC_SQ_HDINP1, A29 URC_SQ_HDINP0, B18 URC_SQ_VCCIB3, B19 URC_SQ_HDINN3, B20 URC_SQ_HDINN2, B22 URC_SQ_HDOUTN3, B23 URC_SQ_HDOUTN2, B24 URC_SQ_VCCAUX33, B25 URC_SQ_HDOUTN1, B26 URC_SQ_HDOUTN0, B28 URC_SQ_HDINN1, B29 URC_SQ_HDINN0, B30 URC_SQ_VCCIB0, C18 URC_SQ_VCCRX3, C19 URC_SQ_VCCRX2, C20 URC_SQ_VCCIB2, C21 URC_SQ_VCCTX3, C22 URC_SQ_VCCTX2, C23 URC_SQ_VCCOB2, C24 URC_SQ_VCCP, C25 URC_SQ_VCCOB1, C26 URC_SQ_VCCTX1, C27 URC_SQ_VCCTX0, C28 URC_SQ_VCCIB1, C29 URC_SQ_VCCRX1, C30 URC_SQ_VCCRX0, D24 URC_SQ_REFCLKP, E24 URC_SQ_REFCLKN